# Altium footprint library RL1.PCBLIB: 94 footprints (part 6 of 6)
Each footprint in its own frame and in the unit in brackets; x right, y up, seen from the top. Pads: shape width x height; smd on the part's side, far side on the other; paste and mask are expansions set on the pad; w line width, h text height; cw(c..) or ccw(c..) is an arc to the next point about the centre after c.
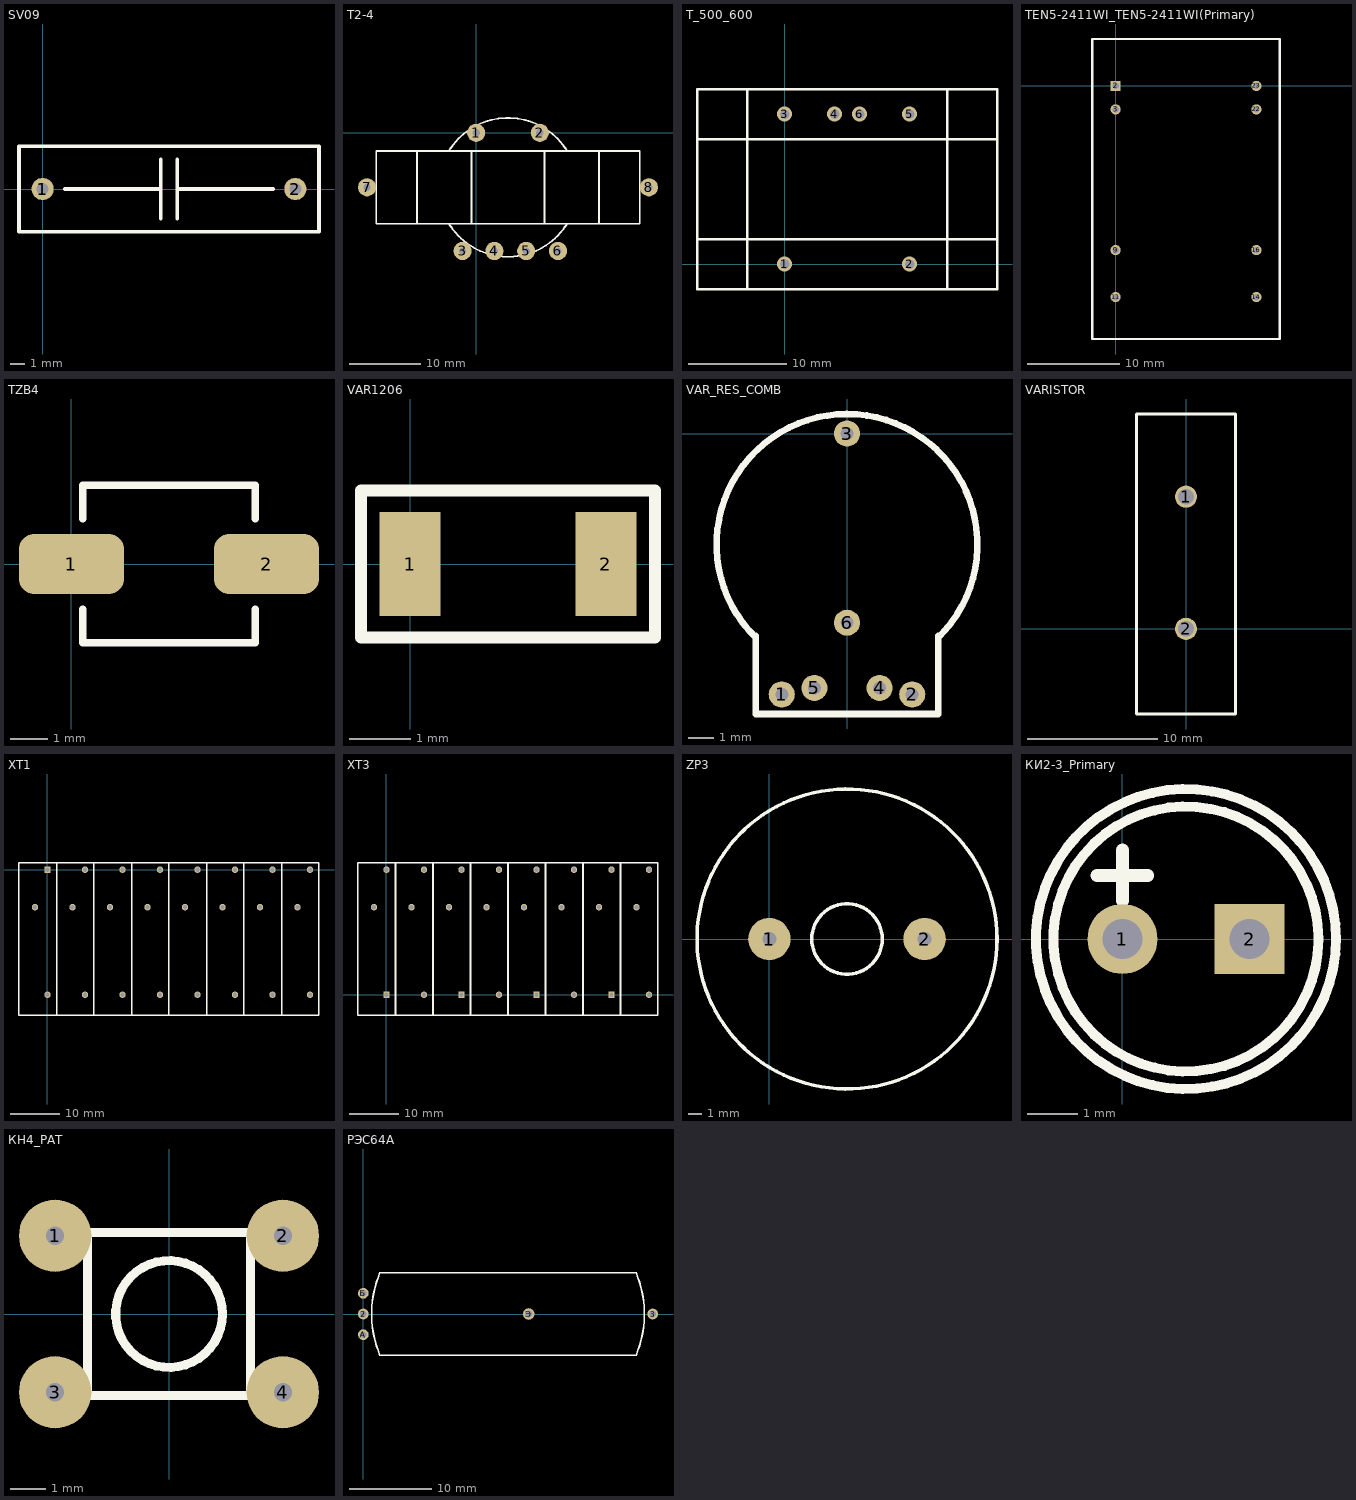
[diagram p5: the footprints below, top view; thin cyan lines are the x and y axes]

## SV09 [mm]
pads (2):
  round 1.5 hole 0.8: 1(0,0) 2(17.1,0)
Top Overlay:
  lines w0.254: 1.5,0 8,0 ; 8,-2 8,2 ; 9.1,-2 9.1,2 ; 9.1,0 15.6,0 ; -1.6,-2.9 18.7,-2.9 18.7,2.9 -1.6,2.9 -1.6,-2.9
Top Assembly:
  text ".Designator" at 13.548,-0.333 h1
3D body "SV09.stp": height 18.31, standoff -2.99, extent -1.25,-2.54 18.35,2.54

## T2-4 [mil]
pads (8):
  round 100 hole 40: 1(0,0) 2(350,0) 3(-75,-650) 4(100,-650) 5(275,-650) 6(450,-650) 7(-600,-300) 8(950,-300)
Top Overlay:
  lines w10: -325,-500 -325,-100 ; -150.03,-499.96 ccw(c175,-300) 500.03,-499.96 ; -150.03,-100.04 cw(c175,-300) 500.03,-100.04 ; -25,-500 -25,-100 ; 375,-500 375,-100 ; 675,-500 675,-100 ; -550,-500 -550,-100 900,-100 900,-500 -550,-500
Top Assembly:
  text ".Designator" at 371.79,-321.81 h39.37

## T_500_600 [mil]
pads (6):
  round 60 hole 38: 1(0,0) 2(500,0) 3(0,600) 4(200,600) 5(500,600) 6(300,600)
Top Overlay:
  lines w10: -350,100 850,100 ; -350,500 850,500 ; -150,-100 -150,700 ; 650,-100 650,700 ; -350,-100 -350,700 850,700 850,-100 -350,-100
Top Assembly:
  text ".Designator" at 446.79,286.88 h39.37

## TEN5-2411WI_TEN5-2411WI(Primary) [mm]
pads (8):
  rect 1.1x1.1 hole 0.7: 2(0,0)
  round 1.1 hole 0.7: 3(0,-2.54) 9(0,-17.78) 11(0,-22.86) 14(15.24,-22.86) 16(15.24,-17.78) 22(15.24,-2.54) 23(15.24,0)
Top Overlay:
  lines w0.254: -2.54,-27.4 17.78,-27.4 ; -2.54,-27.4 17.78,-27.4 ; -2.54,-27.4 -2.54,5.08 17.78,5.08 17.78,-27.4
Top Assembly:
  text ".Designator" at 2.622,-11.493 h1
3D body "User Library-TRACO TEN3.STEP": height 10.2, standoff -5, extent -2.525,-27.03 17.775,4.97

## TZB4 [mm]
pads (2):
  rrect50% 2.8x1.6 smd: 1(0,0) 2(5.2,0)
Top Overlay:
  lines w0.2: 0.3,-1.2 0.3,-2.1 4.9,-2.1 4.9,-1.2 ; 0.3,1.2 0.3,2.1 4.9,2.1 4.9,1.2
Top Assembly:
  text ".Designator" at 7.598,-0.333 h1
3D body "User Library-TZB4.STEP": height 3.2, standoff -0.05, extent -0.923,-2.1 6.123,2.1

## VAR1206 [mm]
pads (2):
  rect 1x1.7 smd: 1(0,0) 2(3.2,0)
Top Overlay:
  lines w0.2: -0.8,-1.2 -0.8,1.2 4,1.2 4,-1.2 -0.8,-1.2
Top Assembly:
  text ".Designator" at 6.598,-0.333 h1
3D body "User Library-V1206HD.STEP": height 1.5, standoff 0, extent 0,-0.8 3.2,0.8

## VAR_RES_COMB [mil]
pads (6):
  round 40 hole 20: 1(-100,-400) 2(100,-400) 3(0,0) 4(50,-390) 5(-50,-390) 6(0,-290)
Top Overlay:
  lines w10: -140,-310 -140,-430 140,-430 140,-310 ; -139.68,-313.14 cw(c0,-170) 139.93,-312.89
Top Assembly:
  text ".Designator" at 196.79,-213.12 h39.37

## VARISTOR [mm]
pads (2):
  round 1.7 hole 1.2: 1(0,10.16) 2(0,0)
Top Overlay:
  lines w0.254: -3.81,16.46 -3.81,-6.54 3.81,-6.54 3.81,16.46 ; -3.81,16.51 3.81,16.51
Top Assembly:
  text ".Designator" at 4.995,4.652 h1
3D body "User Library-S20K275.STEP": height 27.75, standoff -3.5, extent -4.555,-5.584 4.548,15.734

## XT1 [mm]
pads (24):
  round 1.3 hole 0.9: 1(-2.54,-7.62) 3(5.08,-7.62) 4(7.62,0) 5(12.7,-7.62) 6(15.24,0) 7(20.32,-7.62) 8(22.86,0) 9(27.94,-7.62) 10(30.48,0) 11(35.56,-7.62) 12(38.1,0) 13(43.18,-7.62) 14(45.72,0) 15(50.8,-7.62) 16(53.34,0) 17(0,-25.4) 18(7.62,-25.4) 19(15.24,-25.4) 20(22.86,-25.4) 21(30.48,-25.4) 22(38.1,-25.4) 23(45.72,-25.4) 24(53.34,-25.4)
  rect 1.3x1.3 hole 0.9: 2(0,0)
Top Overlay:
  lines w0.254: 1.82,-29.58 9.44,-29.58 9.44,1.42 1.82,1.42 ; 9.46,-29.58 17.08,-29.58 17.08,1.42 9.46,1.42 ; 17.06,-29.58 24.68,-29.58 24.68,1.42 17.06,1.42 ; 24.7,-29.58 32.32,-29.58 32.32,1.42 24.7,1.42 ; 32.3,-29.58 39.92,-29.58 39.92,1.42 32.3,1.42 ; 39.94,-29.58 47.56,-29.58 47.56,1.42 39.94,1.42 ; 47.54,-29.58 55.16,-29.58 55.16,1.42 47.54,1.42 ; -5.78,-29.58 -5.78,1.42 1.84,1.42 1.84,-29.58 -5.78,-29.58
Top Assembly:
  text ".Designator" at 29.688,-14.413 h1

## XT3 [mm]
pads (24):
  rect 1.3x1.3 hole 0.9: 1(0,0) 7(15.24,0) 13(30.48,0) 19(45.72,0)
  round 1.3 hole 0.9: 2(-2.54,17.78) 3(0,25.4) 4(7.62,0) 5(5.08,17.78) 6(7.62,25.4) 8(12.7,17.78) 9(15.24,25.4) 10(22.86,0) 11(20.32,17.78) 12(22.86,25.4) 14(27.94,17.78) 15(30.48,25.4) 16(38.1,0) 17(35.56,17.78) 18(38.1,25.4) 20(43.18,17.78) 21(45.72,25.4) 22(53.34,0) 23(50.8,17.78) 24(53.34,25.4)
Top Overlay:
  lines w0.254: -5.78,-4.18 -5.78,26.82 1.84,26.82 1.84,-4.18 -5.78,-4.18 ; 1.82,-4.18 1.82,26.82 9.44,26.82 9.44,-4.18 1.82,-4.18 ; 9.46,-4.18 9.46,26.82 17.08,26.82 17.08,-4.18 9.46,-4.18 ; 17.06,-4.18 17.06,26.82 24.68,26.82 24.68,-4.18 17.06,-4.18 ; 24.7,-4.18 24.7,26.82 32.32,26.82 32.32,-4.18 24.7,-4.18 ; 32.3,-4.18 32.3,26.82 39.92,26.82 39.92,-4.18 32.3,-4.18 ; 39.94,-4.18 39.94,26.82 47.56,26.82 47.56,-4.18 39.94,-4.18 ; 47.54,-4.18 47.54,26.82 55.16,26.82 55.16,-4.18 47.54,-4.18
Top Assembly:
  text ".Designator" at 29.688,10.987 h1

## ZP3 [mil]
pads (2):
  round 120 hole 40: 1(0,0) 2(440,0)
Top Overlay:
  circle w10: c220,0 r425
  circle w10: c220,0 r100
Top Assembly:
  text ".Designator" at 416.79,-13.12 h39.37

## КИ2-3_Primary [mm]
pads (2):
  round 1.4 hole 0.8: 1(0,0)
  rect 1.4x1.4 hole 0.8: 2(2.54,0)
Top Overlay:
  circle w0.2: c1.27,0 r3
  circle w0.2: c1.27,0 r2.65
  lines w0.254: -0.508,1.27 0.508,1.27 ; 0,0.762 0,1.778
Top Assembly:
  text ".Designator" at 6.268,-0.333 h1

## КН4_PAT [mil]
pads (4):
  round 80 hole 20: 1(-125.98,86.61) 2(125.98,86.61) 3(-125.98,-86.61) 4(125.98,-86.61)
Top Overlay:
  circle w10: c0,0 r59.06
  lines w10: -90,-90 90,-90 90,90 -90,90 -90,-90
Top Assembly:
  text ".Designator" at 196.79,-13.12 h39.37

## РЭС64А [mm]
pads (5):
  round 1.3 hole 0.8: 2(0,0) 3(35,0) А(0,-2.5) Б(0,2.5)
  round 1.4 hole 0.9: Э(20,0)
Top Overlay:
  lines w0.2: 2,-5 cw(c14,0) 2,5 33,5 cw(c21,0) 33,-5 2,-5
Top Assembly:
  text ".Designator" at 22.498,-0.333 h1